# Altium schematic symbol library jlcpcb_2025_04_capacitors_extended_0805.schlib: 3281 symbols (part 13 of 18) (continued)
## FM21X822K101PXG
designator C?  Capacitance: 8.2nF  (hidden comment: *)
Capacitor, Ceramic (MLCC), 8.2nF, ±10%, 100V, X7R, ±10%, SMD 0805; Manufacturer: PSA(Prosperity Dielectrics); Manufacturer Part Number: FM21X822K101PXG; Package Size: 0805; JLCPCB Basic Part: No; JLCPCB Part Number: C565639; Supplier 1: LCSC; Category: Capacitors - MLCC; Supplier Part Number 1: C565639; Tolerance: ±10%; Voltage Rating: 100V; Temperature Coefficient: X7R; RoHS: Yes; ComponentLink1Description: Datasheet; ComponentLink1URL: https://wmsc.lcsc.com/wmsc/upload/file/pdf/v2/lcsc/2304140030_PSA-Prosperity-Dielectrics-FM21X822K101PXG_C565639.pdf; ComponentLink2Description: JLCPCB Part URL; ComponentLink2URL: https://jlcpcb.com/partdetail/C565639; ComponentLink3Description: LCSC Part URL; ComponentLink3URL: https://lcsc.com/product-detail/Multilayer-Ceramic-Capacitors-MLCC---SMD-SMT_PSAProsperity-Dielectrics-PSAProsperity-Dielectrics-FM21X822K101PXG_C565639.html
footprint CAP-0805 (0805 (2012M) Capacitor)
pins: 1, 2

## FM21X822K251ECG
designator C?  Capacitance: 8.2nF  (hidden comment: *)
Capacitor, Ceramic (MLCC), 8.2nF, ±10%, 250V, X7R, ±10%, SMD 0805; Manufacturer: PSA(Prosperity Dielectrics); Manufacturer Part Number: FM21X822K251ECG; Package Size: 0805; JLCPCB Basic Part: No; JLCPCB Part Number: C565661; Supplier 1: LCSC; Category: Capacitors - MLCC; Supplier Part Number 1: C565661; Tolerance: ±10%; Voltage Rating: 250V; Temperature Coefficient: X7R; RoHS: Yes; ComponentLink1Description: Datasheet; ComponentLink1URL: https://wmsc.lcsc.com/wmsc/upload/file/pdf/v2/lcsc/2304140030_PSA-Prosperity-Dielectrics-FM21X822K251ECG_C565661.pdf; ComponentLink2Description: JLCPCB Part URL; ComponentLink2URL: https://jlcpcb.com/partdetail/C565661; ComponentLink3Description: LCSC Part URL; ComponentLink3URL: https://lcsc.com/product-detail/Multilayer-Ceramic-Capacitors-MLCC---SMD-SMT_PSAProsperity-Dielectrics-PSAProsperity-Dielectrics-FM21X822K251ECG_C565661.html
footprint CAP-0805 (0805 (2012M) Capacitor)
pins: 1, 2

## FN21F104Z500PAG
designator C?  Capacitance: 100nF  (hidden comment: *)
Capacitor, Ceramic (MLCC), 100nF, 50V, Y5V, SMD 0805; Manufacturer: PSA(Prosperity Dielectrics); Manufacturer Part Number: FN21F104Z500PAG; Temperature Rating: -20%~+80%; Package Size: 0805; JLCPCB Basic Part: No; JLCPCB Part Number: C525279; Supplier 1: LCSC; Category: Capacitors - MLCC; Supplier Part Number 1: C525279; Voltage Rating: 50V; Temperature Coefficient: Y5V; RoHS: Yes; ComponentLink1Description: Datasheet; ComponentLink1URL: https://wmsc.lcsc.com/wmsc/upload/file/pdf/v2/lcsc/2304140030_PSA-Prosperity-Dielectrics-FN21F104Z500PAG_C525279.pdf; ComponentLink2Description: JLCPCB Part URL; ComponentLink2URL: https://jlcpcb.com/partdetail/C525279; ComponentLink3Description: LCSC Part URL; ComponentLink3URL: https://lcsc.com/product-detail/Multilayer-Ceramic-Capacitors-MLCC---SMD-SMT_PSAProsperity-Dielectrics-PSAProsperity-Dielectrics-FN21F104Z500PAG_C525279.html
footprint CAP-0805 (0805 (2012M) Capacitor)
pins: 1, 2

## FN21N1R0B500PAG
designator C?  Capacitance: 1pF  (hidden comment: *)
Capacitor, Ceramic (MLCC), 1pF, 50V, C0G, SMD 0805; Manufacturer: PSA(Prosperity Dielectrics); Manufacturer Part Number: FN21N1R0B500PAG; Package Size: 0805; JLCPCB Basic Part: No; JLCPCB Part Number: C565640; Supplier 1: LCSC; Category: Capacitors - MLCC; Supplier Part Number 1: C565640; Voltage Rating: 50V; Temperature Coefficient: C0G; RoHS: Yes; ComponentLink1Description: Datasheet; ComponentLink1URL: https://wmsc.lcsc.com/wmsc/upload/file/pdf/v2/lcsc/2304140030_PSA-Prosperity-Dielectrics-FN21N1R0B500PAG_C565640.pdf; ComponentLink2Description: JLCPCB Part URL; ComponentLink2URL: https://jlcpcb.com/partdetail/C565640; ComponentLink3Description: LCSC Part URL; ComponentLink3URL: https://lcsc.com/product-detail/Multilayer-Ceramic-Capacitors-MLCC---SMD-SMT_PSAProsperity-Dielectrics-PSAProsperity-Dielectrics-FN21N1R0B500PAG_C565640.html
footprint CAP-0805 (0805 (2012M) Capacitor)
pins: 1, 2

## FN21N1R0C500PAG
designator C?  Capacitance: 1pF  (hidden comment: *)
Capacitor, Ceramic (MLCC), 1pF, 50V, NP0, SMD 0805; Manufacturer: PSA(Prosperity Dielectrics); Manufacturer Part Number: FN21N1R0C500PAG; Package Size: 0805; JLCPCB Basic Part: No; JLCPCB Part Number: C565578; Supplier 1: LCSC; Category: Capacitors - MLCC; Supplier Part Number 1: C565578; Voltage Rating: 50V; Temperature Coefficient: NP0; RoHS: Yes; ComponentLink1Description: Datasheet; ComponentLink1URL: https://wmsc.lcsc.com/wmsc/upload/file/pdf/v2/lcsc/2304140030_PSA-Prosperity-Dielectrics-FN21N1R0C500PAG_C565578.pdf; ComponentLink2Description: JLCPCB Part URL; ComponentLink2URL: https://jlcpcb.com/partdetail/C565578; ComponentLink3Description: LCSC Part URL; ComponentLink3URL: https://lcsc.com/product-detail/Multilayer-Ceramic-Capacitors-MLCC---SMD-SMT_PSAProsperity-Dielectrics-PSAProsperity-Dielectrics-FN21N1R0C500PAG_C565578.html
footprint CAP-0805 (0805 (2012M) Capacitor)
pins: 1, 2

## FN21N1R2B500PAG
designator C?  Capacitance: 1.2pF  (hidden comment: *)
Capacitor, Ceramic (MLCC), 1.2pF, 50V, C0G, SMD 0805; Manufacturer: PSA(Prosperity Dielectrics); Manufacturer Part Number: FN21N1R2B500PAG; Package Size: 0805; JLCPCB Basic Part: No; JLCPCB Part Number: C565641; Supplier 1: LCSC; Category: Capacitors - MLCC; Supplier Part Number 1: C565641; Voltage Rating: 50V; Temperature Coefficient: C0G; RoHS: Yes; ComponentLink1Description: Datasheet; ComponentLink1URL: https://wmsc.lcsc.com/wmsc/upload/file/pdf/v2/lcsc/2304140030_PSA-Prosperity-Dielectrics-FN21N1R2B500PAG_C565641.pdf; ComponentLink2Description: JLCPCB Part URL; ComponentLink2URL: https://jlcpcb.com/partdetail/C565641; ComponentLink3Description: LCSC Part URL; ComponentLink3URL: https://lcsc.com/product-detail/Multilayer-Ceramic-Capacitors-MLCC---SMD-SMT_PSAProsperity-Dielectrics-PSAProsperity-Dielectrics-FN21N1R2B500PAG_C565641.html
footprint CAP-0805 (0805 (2012M) Capacitor)
pins: 1, 2

## FN21N1R2C500PAG
designator C?  Capacitance: 1.2pF  (hidden comment: *)
Capacitor, Ceramic (MLCC), 1.2pF, 50V, C0G, SMD 0805; Manufacturer: PSA(Prosperity Dielectrics); Manufacturer Part Number: FN21N1R2C500PAG; Package Size: 0805; JLCPCB Basic Part: No; JLCPCB Part Number: C565579; Supplier 1: LCSC; Category: Capacitors - MLCC; Supplier Part Number 1: C565579; Voltage Rating: 50V; Temperature Coefficient: C0G; RoHS: Yes; ComponentLink1Description: Datasheet; ComponentLink1URL: https://wmsc.lcsc.com/wmsc/upload/file/pdf/v2/lcsc/2304140030_PSA-Prosperity-Dielectrics-FN21N1R2C500PAG_C565579.pdf; ComponentLink2Description: JLCPCB Part URL; ComponentLink2URL: https://jlcpcb.com/partdetail/C565579; ComponentLink3Description: LCSC Part URL; ComponentLink3URL: https://lcsc.com/product-detail/Multilayer-Ceramic-Capacitors-MLCC---SMD-SMT_PSAProsperity-Dielectrics-PSAProsperity-Dielectrics-FN21N1R2C500PAG_C565579.html
footprint CAP-0805 (0805 (2012M) Capacitor)
pins: 1, 2

## FN21N1R5B500PAG
designator C?  Capacitance: 1.5pF  (hidden comment: *)
Capacitor, Ceramic (MLCC), 1.5pF, 50V, SMD 0805; Manufacturer: PSA(Prosperity Dielectrics); Manufacturer Part Number: FN21N1R5B500PAG; Package Size: 0805; JLCPCB Basic Part: No; JLCPCB Part Number: C565642; Supplier 1: LCSC; Category: Capacitors - MLCC; Supplier Part Number 1: C565642; Voltage Rating: 50V; RoHS: Yes; ComponentLink1Description: Datasheet; ComponentLink1URL: https://wmsc.lcsc.com/wmsc/upload/file/pdf/v2/lcsc/2304140030_PSA-Prosperity-Dielectrics-FN21N1R5B500PAG_C565642.pdf; ComponentLink2Description: JLCPCB Part URL; ComponentLink2URL: https://jlcpcb.com/partdetail/C565642; ComponentLink3Description: LCSC Part URL; ComponentLink3URL: https://lcsc.com/product-detail/Multilayer-Ceramic-Capacitors-MLCC---SMD-SMT_PSAProsperity-Dielectrics-PSAProsperity-Dielectrics-FN21N1R5B500PAG_C565642.html
footprint CAP-0805 (0805 (2012M) Capacitor)
pins: 1, 2

## FN21N1R5C500PAG
designator C?  Capacitance: 1.5pF  (hidden comment: *)
Capacitor, Ceramic (MLCC), 1.5pF, 50V, SMD 0805; Manufacturer: PSA(Prosperity Dielectrics); Manufacturer Part Number: FN21N1R5C500PAG; Package Size: 0805; JLCPCB Basic Part: No; JLCPCB Part Number: C565580; Supplier 1: LCSC; Category: Capacitors - MLCC; Supplier Part Number 1: C565580; Voltage Rating: 50V; RoHS: Yes; ComponentLink1Description: Datasheet; ComponentLink1URL: https://wmsc.lcsc.com/wmsc/upload/file/pdf/v2/lcsc/2304140030_PSA-Prosperity-Dielectrics-FN21N1R5C500PAG_C565580.pdf; ComponentLink2Description: JLCPCB Part URL; ComponentLink2URL: https://jlcpcb.com/partdetail/C565580; ComponentLink3Description: LCSC Part URL; ComponentLink3URL: https://lcsc.com/product-detail/Multilayer-Ceramic-Capacitors-MLCC---SMD-SMT_PSAProsperity-Dielectrics-PSAProsperity-Dielectrics-FN21N1R5C500PAG_C565580.html
footprint CAP-0805 (0805 (2012M) Capacitor)
pins: 1, 2

## FN21N1R8B500PAG
designator C?  Capacitance: 1.8pF  (hidden comment: *)
Capacitor, Ceramic (MLCC), 1.8pF, 50V, C0G, SMD 0805; Manufacturer: PSA(Prosperity Dielectrics); Manufacturer Part Number: FN21N1R8B500PAG; Package Size: 0805; JLCPCB Basic Part: No; JLCPCB Part Number: C565643; Supplier 1: LCSC; Category: Capacitors - MLCC; Supplier Part Number 1: C565643; Voltage Rating: 50V; Temperature Coefficient: C0G; RoHS: Yes; ComponentLink1Description: Datasheet; ComponentLink1URL: https://wmsc.lcsc.com/wmsc/upload/file/pdf/v2/lcsc/2304140030_PSA-Prosperity-Dielectrics-FN21N1R8B500PAG_C565643.pdf; ComponentLink2Description: JLCPCB Part URL; ComponentLink2URL: https://jlcpcb.com/partdetail/C565643; ComponentLink3Description: LCSC Part URL; ComponentLink3URL: https://lcsc.com/product-detail/Multilayer-Ceramic-Capacitors-MLCC---SMD-SMT_PSAProsperity-Dielectrics-PSAProsperity-Dielectrics-FN21N1R8B500PAG_C565643.html
footprint CAP-0805 (0805 (2012M) Capacitor)
pins: 1, 2

## FN21N1R8C500PAG
designator C?  Capacitance: 1.8pF  (hidden comment: *)
Capacitor, Ceramic (MLCC), 1.8pF, 50V, C0G, SMD 0805; Manufacturer: PSA(Prosperity Dielectrics); Manufacturer Part Number: FN21N1R8C500PAG; Package Size: 0805; JLCPCB Basic Part: No; JLCPCB Part Number: C565581; Supplier 1: LCSC; Category: Capacitors - MLCC; Supplier Part Number 1: C565581; Voltage Rating: 50V; Temperature Coefficient: C0G; RoHS: Yes; ComponentLink1Description: Datasheet; ComponentLink1URL: https://wmsc.lcsc.com/wmsc/upload/file/pdf/v2/lcsc/2304140030_PSA-Prosperity-Dielectrics-FN21N1R8C500PAG_C565581.pdf; ComponentLink2Description: JLCPCB Part URL; ComponentLink2URL: https://jlcpcb.com/partdetail/C565581; ComponentLink3Description: LCSC Part URL; ComponentLink3URL: https://lcsc.com/product-detail/Multilayer-Ceramic-Capacitors-MLCC---SMD-SMT_PSAProsperity-Dielectrics-PSAProsperity-Dielectrics-FN21N1R8C500PAG_C565581.html
footprint CAP-0805 (0805 (2012M) Capacitor)
pins: 1, 2

## FN21N2R2B500PAG
designator C?  Capacitance: 2.2pF  (hidden comment: *)
Capacitor, Ceramic (MLCC), 2.2pF, 50V, C0G, SMD 0805; Manufacturer: PSA(Prosperity Dielectrics); Manufacturer Part Number: FN21N2R2B500PAG; Package Size: 0805; JLCPCB Basic Part: No; JLCPCB Part Number: C565644; Supplier 1: LCSC; Category: Capacitors - MLCC; Supplier Part Number 1: C565644; Voltage Rating: 50V; Temperature Coefficient: C0G; RoHS: Yes; ComponentLink1Description: Datasheet; ComponentLink1URL: https://wmsc.lcsc.com/wmsc/upload/file/pdf/v2/lcsc/2304140030_PSA-Prosperity-Dielectrics-FN21N2R2B500PAG_C565644.pdf; ComponentLink2Description: JLCPCB Part URL; ComponentLink2URL: https://jlcpcb.com/partdetail/C565644; ComponentLink3Description: LCSC Part URL; ComponentLink3URL: https://lcsc.com/product-detail/Multilayer-Ceramic-Capacitors-MLCC---SMD-SMT_PSAProsperity-Dielectrics-PSAProsperity-Dielectrics-FN21N2R2B500PAG_C565644.html
footprint CAP-0805 (0805 (2012M) Capacitor)
pins: 1, 2

## FN21N2R2C500PAG
designator C?  Capacitance: 2.2pF  (hidden comment: *)
Capacitor, Ceramic (MLCC), 2.2pF, 50V, C0G, SMD 0805; Manufacturer: PSA(Prosperity Dielectrics); Manufacturer Part Number: FN21N2R2C500PAG; Package Size: 0805; JLCPCB Basic Part: No; JLCPCB Part Number: C565582; Supplier 1: LCSC; Category: Capacitors - MLCC; Supplier Part Number 1: C565582; Voltage Rating: 50V; Temperature Coefficient: C0G; RoHS: Yes; ComponentLink1Description: Datasheet; ComponentLink1URL: https://wmsc.lcsc.com/wmsc/upload/file/pdf/v2/lcsc/2304140030_PSA-Prosperity-Dielectrics-FN21N2R2C500PAG_C565582.pdf; ComponentLink2Description: JLCPCB Part URL; ComponentLink2URL: https://jlcpcb.com/partdetail/C565582; ComponentLink3Description: LCSC Part URL; ComponentLink3URL: https://lcsc.com/product-detail/Multilayer-Ceramic-Capacitors-MLCC---SMD-SMT_PSAProsperity-Dielectrics-PSAProsperity-Dielectrics-FN21N2R2C500PAG_C565582.html
footprint CAP-0805 (0805 (2012M) Capacitor)
pins: 1, 2

## FN21N2R7C500PAG
designator C?  Capacitance: 2.7pF  (hidden comment: *)
Capacitor, Ceramic (MLCC), 2.7pF, 50V, C0G, SMD 0805; Manufacturer: PSA(Prosperity Dielectrics); Manufacturer Part Number: FN21N2R7C500PAG; Package Size: 0805; JLCPCB Basic Part: No; JLCPCB Part Number: C565583; Supplier 1: LCSC; Category: Capacitors - MLCC; Supplier Part Number 1: C565583; Voltage Rating: 50V; Temperature Coefficient: C0G; RoHS: Yes; ComponentLink1Description: Datasheet; ComponentLink1URL: https://wmsc.lcsc.com/wmsc/upload/file/pdf/v2/lcsc/2304140030_PSA-Prosperity-Dielectrics-FN21N2R7C500PAG_C565583.pdf; ComponentLink2Description: JLCPCB Part URL; ComponentLink2URL: https://jlcpcb.com/partdetail/C565583; ComponentLink3Description: LCSC Part URL; ComponentLink3URL: https://lcsc.com/product-detail/Multilayer-Ceramic-Capacitors-MLCC---SMD-SMT_PSAProsperity-Dielectrics-PSAProsperity-Dielectrics-FN21N2R7C500PAG_C565583.html
footprint CAP-0805 (0805 (2012M) Capacitor)
pins: 1, 2

## FN21N3R3B500PAG
designator C?  Capacitance: 3.3pF  (hidden comment: *)
Capacitor, Ceramic (MLCC), 3.3pF, 50V, C0G, SMD 0805; Manufacturer: PSA(Prosperity Dielectrics); Manufacturer Part Number: FN21N3R3B500PAG; Package Size: 0805; JLCPCB Basic Part: No; JLCPCB Part Number: C565646; Supplier 1: LCSC; Category: Capacitors - MLCC; Supplier Part Number 1: C565646; Voltage Rating: 50V; Temperature Coefficient: C0G; RoHS: Yes; ComponentLink1Description: Datasheet; ComponentLink1URL: https://wmsc.lcsc.com/wmsc/upload/file/pdf/v2/lcsc/2304140030_PSA-Prosperity-Dielectrics-FN21N3R3B500PAG_C565646.pdf; ComponentLink2Description: JLCPCB Part URL; ComponentLink2URL: https://jlcpcb.com/partdetail/C565646; ComponentLink3Description: LCSC Part URL; ComponentLink3URL: https://lcsc.com/product-detail/Multilayer-Ceramic-Capacitors-MLCC---SMD-SMT_PSAProsperity-Dielectrics-PSAProsperity-Dielectrics-FN21N3R3B500PAG_C565646.html
footprint CAP-0805 (0805 (2012M) Capacitor)
pins: 1, 2

## FN21N3R3C500PAG
designator C?  Capacitance: 3.3pF  (hidden comment: *)
Capacitor, Ceramic (MLCC), 3.3pF, 50V, C0G, SMD 0805; Manufacturer: PSA(Prosperity Dielectrics); Manufacturer Part Number: FN21N3R3C500PAG; Package Size: 0805; JLCPCB Basic Part: No; JLCPCB Part Number: C565584; Supplier 1: LCSC; Category: Capacitors - MLCC; Supplier Part Number 1: C565584; Voltage Rating: 50V; Temperature Coefficient: C0G; RoHS: Yes; ComponentLink1Description: Datasheet; ComponentLink1URL: https://wmsc.lcsc.com/wmsc/upload/file/pdf/v2/lcsc/2304140030_PSA-Prosperity-Dielectrics-FN21N3R3C500PAG_C565584.pdf; ComponentLink2Description: JLCPCB Part URL; ComponentLink2URL: https://jlcpcb.com/partdetail/C565584; ComponentLink3Description: LCSC Part URL; ComponentLink3URL: https://lcsc.com/product-detail/Multilayer-Ceramic-Capacitors-MLCC---SMD-SMT_PSAProsperity-Dielectrics-PSAProsperity-Dielectrics-FN21N3R3C500PAG_C565584.html
footprint CAP-0805 (0805 (2012M) Capacitor)
pins: 1, 2

## FN21N3R9B500PAG
designator C?  Capacitance: 3.9pF  (hidden comment: *)
Capacitor, Ceramic (MLCC), 3.9pF, 50V, C0G, SMD 0805; Manufacturer: PSA(Prosperity Dielectrics); Manufacturer Part Number: FN21N3R9B500PAG; Package Size: 0805; JLCPCB Basic Part: No; JLCPCB Part Number: C565647; Supplier 1: LCSC; Category: Capacitors - MLCC; Supplier Part Number 1: C565647; Voltage Rating: 50V; Temperature Coefficient: C0G; RoHS: Yes; ComponentLink1Description: Datasheet; ComponentLink1URL: https://wmsc.lcsc.com/wmsc/upload/file/pdf/v2/lcsc/2304140030_PSA-Prosperity-Dielectrics-FN21N3R9B500PAG_C565647.pdf; ComponentLink2Description: JLCPCB Part URL; ComponentLink2URL: https://jlcpcb.com/partdetail/C565647; ComponentLink3Description: LCSC Part URL; ComponentLink3URL: https://lcsc.com/product-detail/Multilayer-Ceramic-Capacitors-MLCC---SMD-SMT_PSAProsperity-Dielectrics-PSAProsperity-Dielectrics-FN21N3R9B500PAG_C565647.html
footprint CAP-0805 (0805 (2012M) Capacitor)
pins: 1, 2

## FN21N3R9C500PAG
designator C?  Capacitance: 3.9pF  (hidden comment: *)
Capacitor, Ceramic (MLCC), 3.9pF, 50V, C0G, SMD 0805; Manufacturer: PSA(Prosperity Dielectrics); Manufacturer Part Number: FN21N3R9C500PAG; Package Size: 0805; JLCPCB Basic Part: No; JLCPCB Part Number: C565585; Supplier 1: LCSC; Category: Capacitors - MLCC; Supplier Part Number 1: C565585; Voltage Rating: 50V; Temperature Coefficient: C0G; RoHS: Yes; ComponentLink1Description: Datasheet; ComponentLink1URL: https://wmsc.lcsc.com/wmsc/upload/file/pdf/v2/lcsc/2304140030_PSA-Prosperity-Dielectrics-FN21N3R9C500PAG_C565585.pdf; ComponentLink2Description: JLCPCB Part URL; ComponentLink2URL: https://jlcpcb.com/partdetail/C565585; ComponentLink3Description: LCSC Part URL; ComponentLink3URL: https://lcsc.com/product-detail/Multilayer-Ceramic-Capacitors-MLCC---SMD-SMT_PSAProsperity-Dielectrics-PSAProsperity-Dielectrics-FN21N3R9C500PAG_C565585.html
footprint CAP-0805 (0805 (2012M) Capacitor)
pins: 1, 2

## FN21N4R7B500PAG
designator C?  Capacitance: 4.7pF  (hidden comment: *)
Capacitor, Ceramic (MLCC), 4.7pF, 50V, C0G, SMD 0805; Manufacturer: PSA(Prosperity Dielectrics); Manufacturer Part Number: FN21N4R7B500PAG; Package Size: 0805; JLCPCB Basic Part: No; JLCPCB Part Number: C565648; Supplier 1: LCSC; Category: Capacitors - MLCC; Supplier Part Number 1: C565648; Voltage Rating: 50V; Temperature Coefficient: C0G; RoHS: Yes; ComponentLink1Description: Datasheet; ComponentLink1URL: https://wmsc.lcsc.com/wmsc/upload/file/pdf/v2/lcsc/2304140030_PSA-Prosperity-Dielectrics-FN21N4R7B500PAG_C565648.pdf; ComponentLink2Description: JLCPCB Part URL; ComponentLink2URL: https://jlcpcb.com/partdetail/C565648; ComponentLink3Description: LCSC Part URL; ComponentLink3URL: https://lcsc.com/product-detail/Multilayer-Ceramic-Capacitors-MLCC---SMD-SMT_PSAProsperity-Dielectrics-PSAProsperity-Dielectrics-FN21N4R7B500PAG_C565648.html
footprint CAP-0805 (0805 (2012M) Capacitor)
pins: 1, 2

## FN21N4R7C500PAG
designator C?  Capacitance: 4.7pF  (hidden comment: *)
Capacitor, Ceramic (MLCC), 4.7pF, 50V, C0G, SMD 0805; Manufacturer: PSA(Prosperity Dielectrics); Manufacturer Part Number: FN21N4R7C500PAG; Package Size: 0805; JLCPCB Basic Part: No; JLCPCB Part Number: C565586; Supplier 1: LCSC; Category: Capacitors - MLCC; Supplier Part Number 1: C565586; Voltage Rating: 50V; Temperature Coefficient: C0G; RoHS: Yes; ComponentLink1Description: Datasheet; ComponentLink1URL: https://wmsc.lcsc.com/wmsc/upload/file/pdf/v2/lcsc/2304140030_PSA-Prosperity-Dielectrics-FN21N4R7C500PAG_C565586.pdf; ComponentLink2Description: JLCPCB Part URL; ComponentLink2URL: https://jlcpcb.com/partdetail/C565586; ComponentLink3Description: LCSC Part URL; ComponentLink3URL: https://lcsc.com/product-detail/Multilayer-Ceramic-Capacitors-MLCC---SMD-SMT_PSAProsperity-Dielectrics-PSAProsperity-Dielectrics-FN21N4R7C500PAG_C565586.html
footprint CAP-0805 (0805 (2012M) Capacitor)
pins: 1, 2

## FN21N5R6C500PAG
designator C?  Capacitance: 5.6pF  (hidden comment: *)
Capacitor, Ceramic (MLCC), 5.6pF, 50V, C0G, SMD 0805; Manufacturer: PSA(Prosperity Dielectrics); Manufacturer Part Number: FN21N5R6C500PAG; Package Size: 0805; JLCPCB Basic Part: No; JLCPCB Part Number: C565649; Supplier 1: LCSC; Category: Capacitors - MLCC; Supplier Part Number 1: C565649; Voltage Rating: 50V; Temperature Coefficient: C0G; RoHS: Yes; ComponentLink1Description: Datasheet; ComponentLink1URL: https://wmsc.lcsc.com/wmsc/upload/file/pdf/v2/lcsc/2304140030_PSA-Prosperity-Dielectrics-FN21N5R6C500PAG_C565649.pdf; ComponentLink2Description: JLCPCB Part URL; ComponentLink2URL: https://jlcpcb.com/partdetail/C565649; ComponentLink3Description: LCSC Part URL; ComponentLink3URL: https://lcsc.com/product-detail/Multilayer-Ceramic-Capacitors-MLCC---SMD-SMT_PSAProsperity-Dielectrics-PSAProsperity-Dielectrics-FN21N5R6C500PAG_C565649.html
footprint CAP-0805 (0805 (2012M) Capacitor)
pins: 1, 2

## FN21N5R6D500PAG
designator C?  Capacitance: 5.6pF  (hidden comment: *)
Capacitor, Ceramic (MLCC), 5.6pF, 50V, C0G, SMD 0805; Manufacturer: PSA(Prosperity Dielectrics); Manufacturer Part Number: FN21N5R6D500PAG; Package Size: 0805; JLCPCB Basic Part: No; JLCPCB Part Number: C565587; Supplier 1: LCSC; Category: Capacitors - MLCC; Supplier Part Number 1: C565587; Voltage Rating: 50V; Temperature Coefficient: C0G; RoHS: Yes; ComponentLink1Description: Datasheet; ComponentLink1URL: https://wmsc.lcsc.com/wmsc/upload/file/pdf/v2/lcsc/2304140030_PSA-Prosperity-Dielectrics-FN21N5R6D500PAG_C565587.pdf; ComponentLink2Description: JLCPCB Part URL; ComponentLink2URL: https://jlcpcb.com/partdetail/C565587; ComponentLink3Description: LCSC Part URL; ComponentLink3URL: https://lcsc.com/product-detail/Multilayer-Ceramic-Capacitors-MLCC---SMD-SMT_PSAProsperity-Dielectrics-PSAProsperity-Dielectrics-FN21N5R6D500PAG_C565587.html
footprint CAP-0805 (0805 (2012M) Capacitor)
pins: 1, 2

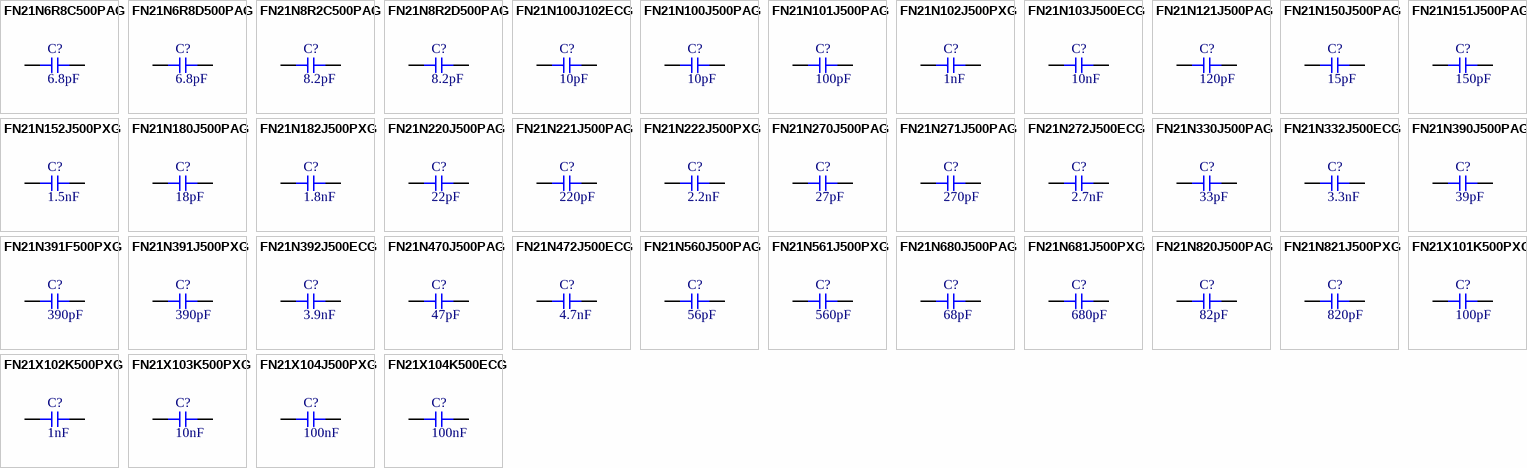
[diagram p58: symbols FN21N6R8C500PAG to FN21X104K500ECG]

## FN21N6R8C500PAG
designator C?  Capacitance: 6.8pF  (hidden comment: *)
Capacitor, Ceramic (MLCC), 6.8pF, 50V, NP0, SMD 0805; Manufacturer: PSA(Prosperity Dielectrics); Manufacturer Part Number: FN21N6R8C500PAG; Package Size: 0805; JLCPCB Basic Part: No; JLCPCB Part Number: C565650; Supplier 1: LCSC; Category: Capacitors - MLCC; Supplier Part Number 1: C565650; Voltage Rating: 50V; Temperature Coefficient: NP0; RoHS: Yes; ComponentLink1Description: Datasheet; ComponentLink1URL: https://wmsc.lcsc.com/wmsc/upload/file/pdf/v2/lcsc/2304140030_PSA-Prosperity-Dielectrics-FN21N6R8C500PAG_C565650.pdf; ComponentLink2Description: JLCPCB Part URL; ComponentLink2URL: https://jlcpcb.com/partdetail/C565650; ComponentLink3Description: LCSC Part URL; ComponentLink3URL: https://lcsc.com/product-detail/Multilayer-Ceramic-Capacitors-MLCC---SMD-SMT_PSAProsperity-Dielectrics-PSAProsperity-Dielectrics-FN21N6R8C500PAG_C565650.html
footprint CAP-0805 (0805 (2012M) Capacitor)
pins: 1, 2

## FN21N6R8D500PAG
designator C?  Capacitance: 6.8pF  (hidden comment: *)
Capacitor, Ceramic (MLCC), 6.8pF, 50V, C0G, SMD 0805; Manufacturer: PSA(Prosperity Dielectrics); Manufacturer Part Number: FN21N6R8D500PAG; Package Size: 0805; JLCPCB Basic Part: No; JLCPCB Part Number: C565588; Supplier 1: LCSC; Category: Capacitors - MLCC; Supplier Part Number 1: C565588; Voltage Rating: 50V; Temperature Coefficient: C0G; RoHS: Yes; ComponentLink1Description: Datasheet; ComponentLink1URL: https://wmsc.lcsc.com/wmsc/upload/file/pdf/v2/lcsc/2304140030_PSA-Prosperity-Dielectrics-FN21N6R8D500PAG_C565588.pdf; ComponentLink2Description: JLCPCB Part URL; ComponentLink2URL: https://jlcpcb.com/partdetail/C565588; ComponentLink3Description: LCSC Part URL; ComponentLink3URL: https://lcsc.com/product-detail/Multilayer-Ceramic-Capacitors-MLCC---SMD-SMT_PSAProsperity-Dielectrics-PSAProsperity-Dielectrics-FN21N6R8D500PAG_C565588.html
footprint CAP-0805 (0805 (2012M) Capacitor)
pins: 1, 2

## FN21N8R2C500PAG
designator C?  Capacitance: 8.2pF  (hidden comment: *)
Capacitor, Ceramic (MLCC), 8.2pF, 50V, C0G, SMD 0805; Manufacturer: PSA(Prosperity Dielectrics); Manufacturer Part Number: FN21N8R2C500PAG; Package Size: 0805; JLCPCB Basic Part: No; JLCPCB Part Number: C565651; Supplier 1: LCSC; Category: Capacitors - MLCC; Supplier Part Number 1: C565651; Voltage Rating: 50V; Temperature Coefficient: C0G; RoHS: Yes; ComponentLink1Description: Datasheet; ComponentLink1URL: https://wmsc.lcsc.com/wmsc/upload/file/pdf/v2/lcsc/2304140030_PSA-Prosperity-Dielectrics-FN21N8R2C500PAG_C565651.pdf; ComponentLink2Description: JLCPCB Part URL; ComponentLink2URL: https://jlcpcb.com/partdetail/C565651; ComponentLink3Description: LCSC Part URL; ComponentLink3URL: https://lcsc.com/product-detail/Multilayer-Ceramic-Capacitors-MLCC---SMD-SMT_PSAProsperity-Dielectrics-PSAProsperity-Dielectrics-FN21N8R2C500PAG_C565651.html
footprint CAP-0805 (0805 (2012M) Capacitor)
pins: 1, 2

## FN21N8R2D500PAG
designator C?  Capacitance: 8.2pF  (hidden comment: *)
Capacitor, Ceramic (MLCC), 8.2pF, 50V, C0G, SMD 0805; Manufacturer: PSA(Prosperity Dielectrics); Manufacturer Part Number: FN21N8R2D500PAG; Package Size: 0805; JLCPCB Basic Part: No; JLCPCB Part Number: C565589; Supplier 1: LCSC; Category: Capacitors - MLCC; Supplier Part Number 1: C565589; Voltage Rating: 50V; Temperature Coefficient: C0G; RoHS: Yes; ComponentLink1Description: Datasheet; ComponentLink1URL: https://wmsc.lcsc.com/wmsc/upload/file/pdf/v2/lcsc/2304140030_PSA-Prosperity-Dielectrics-FN21N8R2D500PAG_C565589.pdf; ComponentLink2Description: JLCPCB Part URL; ComponentLink2URL: https://jlcpcb.com/partdetail/C565589; ComponentLink3Description: LCSC Part URL; ComponentLink3URL: https://lcsc.com/product-detail/Multilayer-Ceramic-Capacitors-MLCC---SMD-SMT_PSAProsperity-Dielectrics-PSAProsperity-Dielectrics-FN21N8R2D500PAG_C565589.html
footprint CAP-0805 (0805 (2012M) Capacitor)
pins: 1, 2

## FN21N100J102ECG
designator C?  Capacitance: 10pF  (hidden comment: *)
Capacitor, Ceramic (MLCC), 10pF, ±5%, 1kV, ±5%, SMD 0805; Manufacturer: PSA(Prosperity Dielectrics); Manufacturer Part Number: FN21N100J102ECG; Package Size: 0805; JLCPCB Basic Part: No; JLCPCB Part Number: C565669; Supplier 1: LCSC; Category: Capacitors - MLCC; Supplier Part Number 1: C565669; Tolerance: ±5%; Voltage Rating: 1kV; RoHS: Yes; ComponentLink1Description: Datasheet; ComponentLink1URL: https://wmsc.lcsc.com/wmsc/upload/file/pdf/v2/lcsc/2304140030_PSA-Prosperity-Dielectrics-FN21N100J102ECG_C565669.pdf; ComponentLink2Description: JLCPCB Part URL; ComponentLink2URL: https://jlcpcb.com/partdetail/C565669; ComponentLink3Description: LCSC Part URL; ComponentLink3URL: https://lcsc.com/product-detail/Multilayer-Ceramic-Capacitors-MLCC---SMD-SMT_PSAProsperity-Dielectrics-PSAProsperity-Dielectrics-FN21N100J102ECG_C565669.html
footprint CAP-0805 (0805 (2012M) Capacitor)
pins: 1, 2

## FN21N100J500PAG
designator C?  Capacitance: 10pF  (hidden comment: *)
Capacitor, Ceramic (MLCC), 10pF, ±5%, 50V, C0G, ±5%, SMD 0805; Manufacturer: PSA(Prosperity Dielectrics); Manufacturer Part Number: FN21N100J500PAG; Package Size: 0805; JLCPCB Basic Part: No; JLCPCB Part Number: C525280; Supplier 1: LCSC; Category: Capacitors - MLCC; Supplier Part Number 1: C525280; Tolerance: ±5%; Voltage Rating: 50V; Temperature Coefficient: C0G; RoHS: Yes; ComponentLink1Description: Datasheet; ComponentLink1URL: https://wmsc.lcsc.com/wmsc/upload/file/pdf/v2/lcsc/2304140030_PSA-Prosperity-Dielectrics-FN21N100J500PAG_C525280.pdf; ComponentLink2Description: JLCPCB Part URL; ComponentLink2URL: https://jlcpcb.com/partdetail/C525280; ComponentLink3Description: LCSC Part URL; ComponentLink3URL: https://lcsc.com/product-detail/Multilayer-Ceramic-Capacitors-MLCC---SMD-SMT_PSAProsperity-Dielectrics-PSAProsperity-Dielectrics-FN21N100J500PAG_C525280.html
footprint CAP-0805 (0805 (2012M) Capacitor)
pins: 1, 2

## FN21N101J500PAG
designator C?  Capacitance: 100pF  (hidden comment: *)
Capacitor, Ceramic (MLCC), 100pF, ±5%, 50V, C0G, ±5%, SMD 0805; Manufacturer: PSA(Prosperity Dielectrics); Manufacturer Part Number: FN21N101J500PAG; Package Size: 0805; JLCPCB Basic Part: No; JLCPCB Part Number: C525281; Supplier 1: LCSC; Category: Capacitors - MLCC; Supplier Part Number 1: C525281; Tolerance: ±5%; Voltage Rating: 50V; Temperature Coefficient: C0G; RoHS: Yes; ComponentLink1Description: Datasheet; ComponentLink1URL: https://wmsc.lcsc.com/wmsc/upload/file/pdf/v2/lcsc/2304140030_PSA-Prosperity-Dielectrics-FN21N101J500PAG_C525281.pdf; ComponentLink2Description: JLCPCB Part URL; ComponentLink2URL: https://jlcpcb.com/partdetail/C525281; ComponentLink3Description: LCSC Part URL; ComponentLink3URL: https://lcsc.com/product-detail/Multilayer-Ceramic-Capacitors-MLCC---SMD-SMT_PSAProsperity-Dielectrics-PSAProsperity-Dielectrics-FN21N101J500PAG_C525281.html
footprint CAP-0805 (0805 (2012M) Capacitor)
pins: 1, 2

## FN21N102J500PXG
designator C?  Capacitance: 1nF  (hidden comment: *)
Capacitor, Ceramic (MLCC), 1nF, ±5%, 50V, C0G, ±5%, SMD 0805; Manufacturer: PSA(Prosperity Dielectrics); Manufacturer Part Number: FN21N102J500PXG; Package Size: 0805; JLCPCB Basic Part: No; JLCPCB Part Number: C525282; Supplier 1: LCSC; Category: Capacitors - MLCC; Supplier Part Number 1: C525282; Tolerance: ±5%; Voltage Rating: 50V; Temperature Coefficient: C0G; RoHS: Yes; ComponentLink1Description: Datasheet; ComponentLink1URL: https://wmsc.lcsc.com/wmsc/upload/file/pdf/v2/lcsc/2304140030_PSA-Prosperity-Dielectrics-FN21N102J500PXG_C525282.pdf; ComponentLink2Description: JLCPCB Part URL; ComponentLink2URL: https://jlcpcb.com/partdetail/C525282; ComponentLink3Description: LCSC Part URL; ComponentLink3URL: https://lcsc.com/product-detail/Multilayer-Ceramic-Capacitors-MLCC---SMD-SMT_PSAProsperity-Dielectrics-PSAProsperity-Dielectrics-FN21N102J500PXG_C525282.html
footprint CAP-0805 (0805 (2012M) Capacitor)
pins: 1, 2

## FN21N103J500ECG
designator C?  Capacitance: 10nF  (hidden comment: *)
Capacitor, Ceramic (MLCC), 10nF, ±5%, 50V, C0G, ±5%, SMD 0805; Manufacturer: PSA(Prosperity Dielectrics); Manufacturer Part Number: FN21N103J500ECG; Package Size: 0805; JLCPCB Basic Part: No; JLCPCB Part Number: C525283; Supplier 1: LCSC; Category: Capacitors - MLCC; Supplier Part Number 1: C525283; Tolerance: ±5%; Voltage Rating: 50V; Temperature Coefficient: C0G; RoHS: Yes; ComponentLink1Description: Datasheet; ComponentLink1URL: https://wmsc.lcsc.com/wmsc/upload/file/pdf/v2/lcsc/2304140030_PSA-Prosperity-Dielectrics-FN21N103J500ECG_C525283.pdf; ComponentLink2Description: JLCPCB Part URL; ComponentLink2URL: https://jlcpcb.com/partdetail/C525283; ComponentLink3Description: LCSC Part URL; ComponentLink3URL: https://lcsc.com/product-detail/Multilayer-Ceramic-Capacitors-MLCC---SMD-SMT_PSAProsperity-Dielectrics-PSAProsperity-Dielectrics-FN21N103J500ECG_C525283.html
footprint CAP-0805 (0805 (2012M) Capacitor)
pins: 1, 2

## FN21N121J500PAG
designator C?  Capacitance: 120pF  (hidden comment: *)
Capacitor, Ceramic (MLCC), 120pF, 50V, C0G, SMD 0805; Manufacturer: PSA(Prosperity Dielectrics); Manufacturer Part Number: FN21N121J500PAG; Package Size: 0805; JLCPCB Basic Part: No; JLCPCB Part Number: C2847440; Supplier 1: LCSC; Category: Capacitors - MLCC; Supplier Part Number 1: C2847440; Voltage Rating: 50V; Temperature Coefficient: C0G; RoHS: Yes; ComponentLink1Description: Datasheet; ComponentLink1URL: https://wmsc.lcsc.com/wmsc/upload/file/pdf/v2/lcsc/2108142230_PSA-Prosperity-Dielectrics-FN21N121J500PAG_C2847440.pdf; ComponentLink2Description: JLCPCB Part URL; ComponentLink2URL: https://jlcpcb.com/partdetail/C2847440; ComponentLink3Description: LCSC Part URL; ComponentLink3URL: https://lcsc.com/product-detail/Multilayer-Ceramic-Capacitors-MLCC---SMD-SMT_PSAProsperity-Dielectrics-PSAProsperity-Dielectrics-FN21N121J500PAG_C2847440.html
footprint CAP-0805 (0805 (2012M) Capacitor)
pins: 1, 2

## FN21N150J500PAG
designator C?  Capacitance: 15pF  (hidden comment: *)
Capacitor, Ceramic (MLCC), 15pF, ±5%, 50V, C0G, ±5%, SMD 0805; Manufacturer: PSA(Prosperity Dielectrics); Manufacturer Part Number: FN21N150J500PAG; Package Size: 0805; JLCPCB Basic Part: No; JLCPCB Part Number: C525285; Supplier 1: LCSC; Category: Capacitors - MLCC; Supplier Part Number 1: C525285; Tolerance: ±5%; Voltage Rating: 50V; Temperature Coefficient: C0G; RoHS: Yes; ComponentLink1Description: Datasheet; ComponentLink1URL: https://wmsc.lcsc.com/wmsc/upload/file/pdf/v2/lcsc/2304140030_PSA-Prosperity-Dielectrics-FN21N150J500PAG_C525285.pdf; ComponentLink2Description: JLCPCB Part URL; ComponentLink2URL: https://jlcpcb.com/partdetail/C525285; ComponentLink3Description: LCSC Part URL; ComponentLink3URL: https://lcsc.com/product-detail/Multilayer-Ceramic-Capacitors-MLCC---SMD-SMT_PSAProsperity-Dielectrics-PSAProsperity-Dielectrics-FN21N150J500PAG_C525285.html
footprint CAP-0805 (0805 (2012M) Capacitor)
pins: 1, 2

## FN21N151J500PAG
designator C?  Capacitance: 150pF  (hidden comment: *)
Capacitor, Ceramic (MLCC), 150pF, 50V, C0G, SMD 0805; Manufacturer: PSA(Prosperity Dielectrics); Manufacturer Part Number: FN21N151J500PAG; Package Size: 0805; JLCPCB Basic Part: No; JLCPCB Part Number: C2847439; Supplier 1: LCSC; Category: Capacitors - MLCC; Supplier Part Number 1: C2847439; Voltage Rating: 50V; Temperature Coefficient: C0G; RoHS: Yes; ComponentLink1Description: Datasheet; ComponentLink1URL: https://wmsc.lcsc.com/wmsc/upload/file/pdf/v2/lcsc/2108142230_PSA-Prosperity-Dielectrics-FN21N151J500PAG_C2847439.pdf; ComponentLink2Description: JLCPCB Part URL; ComponentLink2URL: https://jlcpcb.com/partdetail/C2847439; ComponentLink3Description: LCSC Part URL; ComponentLink3URL: https://lcsc.com/product-detail/Multilayer-Ceramic-Capacitors-MLCC---SMD-SMT_PSAProsperity-Dielectrics-PSAProsperity-Dielectrics-FN21N151J500PAG_C2847439.html
footprint CAP-0805 (0805 (2012M) Capacitor)
pins: 1, 2

## FN21N152J500PXG
designator C?  Capacitance: 1.5nF  (hidden comment: *)
Capacitor, Ceramic (MLCC), 1.5nF, 50V, C0G, SMD 0805; Manufacturer: PSA(Prosperity Dielectrics); Manufacturer Part Number: FN21N152J500PXG; Package Size: 0805; JLCPCB Basic Part: No; JLCPCB Part Number: C2874754; Supplier 1: LCSC; Category: Capacitors - MLCC; Supplier Part Number 1: C2874754; Voltage Rating: 50V; Temperature Coefficient: C0G; RoHS: Yes; ComponentLink1Description: Datasheet; ComponentLink1URL: https://wmsc.lcsc.com/wmsc/upload/file/pdf/v2/lcsc/2108150330_PSA-Prosperity-Dielectrics-FN21N152J500PXG_C2874754.pdf; ComponentLink2Description: JLCPCB Part URL; ComponentLink2URL: https://jlcpcb.com/partdetail/C2874754; ComponentLink3Description: LCSC Part URL; ComponentLink3URL: https://lcsc.com/product-detail/Multilayer-Ceramic-Capacitors-MLCC---SMD-SMT_PSAProsperity-Dielectrics-PSAProsperity-Dielectrics-FN21N152J500PXG_C2874754.html
footprint CAP-0805 (0805 (2012M) Capacitor)
pins: 1, 2

## FN21N180J500PAG
designator C?  Capacitance: 18pF  (hidden comment: *)
Capacitor, Ceramic (MLCC), 18pF, ±5%, 50V, C0G, ±5%, SMD 0805; Manufacturer: PSA(Prosperity Dielectrics); Manufacturer Part Number: FN21N180J500PAG; Package Size: 0805; JLCPCB Basic Part: No; JLCPCB Part Number: C565575; Supplier 1: LCSC; Category: Capacitors - MLCC; Supplier Part Number 1: C565575; Tolerance: ±5%; Voltage Rating: 50V; Temperature Coefficient: C0G; RoHS: Yes; ComponentLink1Description: Datasheet; ComponentLink1URL: https://wmsc.lcsc.com/wmsc/upload/file/pdf/v2/lcsc/2304140030_PSA-Prosperity-Dielectrics-FN21N180J500PAG_C565575.pdf; ComponentLink2Description: JLCPCB Part URL; ComponentLink2URL: https://jlcpcb.com/partdetail/C565575; ComponentLink3Description: LCSC Part URL; ComponentLink3URL: https://lcsc.com/product-detail/Multilayer-Ceramic-Capacitors-MLCC---SMD-SMT_PSAProsperity-Dielectrics-PSAProsperity-Dielectrics-FN21N180J500PAG_C565575.html
footprint CAP-0805 (0805 (2012M) Capacitor)
pins: 1, 2

## FN21N182J500PXG
designator C?  Capacitance: 1.8nF  (hidden comment: *)
Capacitor, Ceramic (MLCC), 1.8nF, 50V, C0G, SMD 0805; Manufacturer: PSA(Prosperity Dielectrics); Manufacturer Part Number: FN21N182J500PXG; Package Size: 0805; JLCPCB Basic Part: No; JLCPCB Part Number: C2929167; Supplier 1: LCSC; Category: Capacitors - MLCC; Supplier Part Number 1: C2929167; Voltage Rating: 50V; Temperature Coefficient: C0G; RoHS: Yes; ComponentLink1Description: Datasheet; ComponentLink1URL: https://wmsc.lcsc.com/wmsc/upload/file/pdf/v2/lcsc/2201121400_PSA-Prosperity-Dielectrics-FN21N182J500PXG_C2929167.pdf; ComponentLink2Description: JLCPCB Part URL; ComponentLink2URL: https://jlcpcb.com/partdetail/C2929167; ComponentLink3Description: LCSC Part URL; ComponentLink3URL: https://lcsc.com/product-detail/Multilayer-Ceramic-Capacitors-MLCC---SMD-SMT_PSAProsperity-Dielectrics-PSAProsperity-Dielectrics-FN21N182J500PXG_C2929167.html
footprint CAP-0805 (0805 (2012M) Capacitor)
pins: 1, 2

## FN21N220J500PAG
designator C?  Capacitance: 22pF  (hidden comment: *)
Capacitor, Ceramic (MLCC), 22pF, ±5%, 50V, NP0, ±5%, SMD 0805; Manufacturer: PSA(Prosperity Dielectrics); Manufacturer Part Number: FN21N220J500PAG; Package Size: 0805; JLCPCB Basic Part: No; JLCPCB Part Number: C525286; Supplier 1: LCSC; Category: Capacitors - MLCC; Supplier Part Number 1: C525286; Tolerance: ±5%; Voltage Rating: 50V; Temperature Coefficient: NP0; RoHS: Yes; ComponentLink1Description: Datasheet; ComponentLink1URL: https://wmsc.lcsc.com/wmsc/upload/file/pdf/v2/lcsc/2304140030_PSA-Prosperity-Dielectrics-FN21N220J500PAG_C525286.pdf; ComponentLink2Description: JLCPCB Part URL; ComponentLink2URL: https://jlcpcb.com/partdetail/C525286; ComponentLink3Description: LCSC Part URL; ComponentLink3URL: https://lcsc.com/product-detail/Multilayer-Ceramic-Capacitors-MLCC---SMD-SMT_PSAProsperity-Dielectrics-PSAProsperity-Dielectrics-FN21N220J500PAG_C525286.html
footprint CAP-0805 (0805 (2012M) Capacitor)
pins: 1, 2

## FN21N221J500PAG
designator C?  Capacitance: 220pF  (hidden comment: *)
Capacitor, Ceramic (MLCC), 220pF, ±5%, 50V, C0G, ±5%, SMD 0805; Manufacturer: PSA(Prosperity Dielectrics); Manufacturer Part Number: FN21N221J500PAG; Package Size: 0805; JLCPCB Basic Part: No; JLCPCB Part Number: C525287; Supplier 1: LCSC; Category: Capacitors - MLCC; Supplier Part Number 1: C525287; Tolerance: ±5%; Voltage Rating: 50V; Temperature Coefficient: C0G; RoHS: Yes; ComponentLink1Description: Datasheet; ComponentLink1URL: https://wmsc.lcsc.com/wmsc/upload/file/pdf/v2/lcsc/2304140030_PSA-Prosperity-Dielectrics-FN21N221J500PAG_C525287.pdf; ComponentLink2Description: JLCPCB Part URL; ComponentLink2URL: https://jlcpcb.com/partdetail/C525287; ComponentLink3Description: LCSC Part URL; ComponentLink3URL: https://lcsc.com/product-detail/Multilayer-Ceramic-Capacitors-MLCC---SMD-SMT_PSAProsperity-Dielectrics-PSAProsperity-Dielectrics-FN21N221J500PAG_C525287.html
footprint CAP-0805 (0805 (2012M) Capacitor)
pins: 1, 2

## FN21N222J500PXG
designator C?  Capacitance: 2.2nF  (hidden comment: *)
Capacitor, Ceramic (MLCC), 2.2nF, ±5%, 50V, NP0, ±5%, SMD 0805; Manufacturer: PSA(Prosperity Dielectrics); Manufacturer Part Number: FN21N222J500PXG; Package Size: 0805; JLCPCB Basic Part: No; JLCPCB Part Number: C525288; Supplier 1: LCSC; Category: Capacitors - MLCC; Supplier Part Number 1: C525288; Tolerance: ±5%; Voltage Rating: 50V; Temperature Coefficient: NP0; RoHS: Yes; ComponentLink1Description: Datasheet; ComponentLink1URL: https://wmsc.lcsc.com/wmsc/upload/file/pdf/v2/lcsc/2304140030_PSA-Prosperity-Dielectrics-FN21N222J500PXG_C525288.pdf; ComponentLink2Description: JLCPCB Part URL; ComponentLink2URL: https://jlcpcb.com/partdetail/C525288; ComponentLink3Description: LCSC Part URL; ComponentLink3URL: https://lcsc.com/product-detail/Multilayer-Ceramic-Capacitors-MLCC---SMD-SMT_PSAProsperity-Dielectrics-PSAProsperity-Dielectrics-FN21N222J500PXG_C525288.html
footprint CAP-0805 (0805 (2012M) Capacitor)
pins: 1, 2

## FN21N270J500PAG
designator C?  Capacitance: 27pF  (hidden comment: *)
Capacitor, Ceramic (MLCC), 27pF, ±5%, 50V, C0G, ±5%, SMD 0805; Manufacturer: PSA(Prosperity Dielectrics); Manufacturer Part Number: FN21N270J500PAG; Package Size: 0805; JLCPCB Basic Part: No; JLCPCB Part Number: C525289; Supplier 1: LCSC; Category: Capacitors - MLCC; Supplier Part Number 1: C525289; Tolerance: ±5%; Voltage Rating: 50V; Temperature Coefficient: C0G; RoHS: Yes; ComponentLink1Description: Datasheet; ComponentLink1URL: https://wmsc.lcsc.com/wmsc/upload/file/pdf/v2/lcsc/2304140030_PSA-Prosperity-Dielectrics-FN21N270J500PAG_C525289.pdf; ComponentLink2Description: JLCPCB Part URL; ComponentLink2URL: https://jlcpcb.com/partdetail/C525289; ComponentLink3Description: LCSC Part URL; ComponentLink3URL: https://lcsc.com/product-detail/Multilayer-Ceramic-Capacitors-MLCC---SMD-SMT_PSAProsperity-Dielectrics-PSAProsperity-Dielectrics-FN21N270J500PAG_C525289.html
footprint CAP-0805 (0805 (2012M) Capacitor)
pins: 1, 2

## FN21N271J500PAG
designator C?  Capacitance: 270pF  (hidden comment: *)
Capacitor, Ceramic (MLCC), 270pF, 50V, C0G, SMD 0805; Manufacturer: PSA(Prosperity Dielectrics); Manufacturer Part Number: FN21N271J500PAG; Package Size: 0805; JLCPCB Basic Part: No; JLCPCB Part Number: C2847437; Supplier 1: LCSC; Category: Capacitors - MLCC; Supplier Part Number 1: C2847437; Voltage Rating: 50V; Temperature Coefficient: C0G; RoHS: Yes; ComponentLink1Description: Datasheet; ComponentLink1URL: https://wmsc.lcsc.com/wmsc/upload/file/pdf/v2/lcsc/2108142230_PSA-Prosperity-Dielectrics-FN21N271J500PAG_C2847437.pdf; ComponentLink2Description: JLCPCB Part URL; ComponentLink2URL: https://jlcpcb.com/partdetail/C2847437; ComponentLink3Description: LCSC Part URL; ComponentLink3URL: https://lcsc.com/product-detail/Multilayer-Ceramic-Capacitors-MLCC---SMD-SMT_PSAProsperity-Dielectrics-PSAProsperity-Dielectrics-FN21N271J500PAG_C2847437.html
footprint CAP-0805 (0805 (2012M) Capacitor)
pins: 1, 2

## FN21N272J500ECG
designator C?  Capacitance: 2.7nF  (hidden comment: *)
Capacitor, Ceramic (MLCC), 2.7nF, 50V, C0G, SMD 0805; Manufacturer: PSA(Prosperity Dielectrics); Manufacturer Part Number: FN21N272J500ECG; Package Size: 0805; JLCPCB Basic Part: No; JLCPCB Part Number: C2915673; Supplier 1: LCSC; Category: Capacitors - MLCC; Supplier Part Number 1: C2915673; Voltage Rating: 50V; Temperature Coefficient: C0G; RoHS: Yes; ComponentLink1Description: Datasheet; ComponentLink1URL: https://wmsc.lcsc.com/wmsc/upload/file/pdf/v2/lcsc/2111172030_PSA-Prosperity-Dielectrics-FN21N272J500ECG_C2915673.pdf; ComponentLink2Description: JLCPCB Part URL; ComponentLink2URL: https://jlcpcb.com/partdetail/C2915673; ComponentLink3Description: LCSC Part URL; ComponentLink3URL: https://lcsc.com/product-detail/Multilayer-Ceramic-Capacitors-MLCC---SMD-SMT_PSAProsperity-Dielectrics-PSAProsperity-Dielectrics-FN21N272J500ECG_C2915673.html
footprint CAP-0805 (0805 (2012M) Capacitor)
pins: 1, 2

## FN21N330J500PAG
designator C?  Capacitance: 33pF  (hidden comment: *)
Capacitor, Ceramic (MLCC), 33pF, ±5%, 50V, C0G, ±5%, SMD 0805; Manufacturer: PSA(Prosperity Dielectrics); Manufacturer Part Number: FN21N330J500PAG; Package Size: 0805; JLCPCB Basic Part: No; JLCPCB Part Number: C363562; Supplier 1: LCSC; Category: Capacitors - MLCC; Supplier Part Number 1: C363562; Tolerance: ±5%; Voltage Rating: 50V; Temperature Coefficient: C0G; RoHS: Yes; ComponentLink1Description: Datasheet; ComponentLink1URL: https://wmsc.lcsc.com/wmsc/upload/file/pdf/v2/lcsc/2304140030_PSA-Prosperity-Dielectrics-FN21N330J500PAG_C363562.pdf; ComponentLink2Description: JLCPCB Part URL; ComponentLink2URL: https://jlcpcb.com/partdetail/C363562; ComponentLink3Description: LCSC Part URL; ComponentLink3URL: https://lcsc.com/product-detail/Multilayer-Ceramic-Capacitors-MLCC---SMD-SMT_PSAProsperity-Dielectrics-PSAProsperity-Dielectrics-FN21N330J500PAG_C363562.html
footprint CAP-0805 (0805 (2012M) Capacitor)
pins: 1, 2

## FN21N332J500ECG
designator C?  Capacitance: 3.3nF  (hidden comment: *)
Capacitor, Ceramic (MLCC), 3.3nF, 50V, C0G, SMD 0805; Manufacturer: PSA(Prosperity Dielectrics); Manufacturer Part Number: FN21N332J500ECG; Package Size: 0805; JLCPCB Basic Part: No; JLCPCB Part Number: C2915674; Supplier 1: LCSC; Category: Capacitors - MLCC; Supplier Part Number 1: C2915674; Voltage Rating: 50V; Temperature Coefficient: C0G; RoHS: Yes; ComponentLink1Description: Datasheet; ComponentLink1URL: https://wmsc.lcsc.com/wmsc/upload/file/pdf/v2/lcsc/2111172030_PSA-Prosperity-Dielectrics-FN21N332J500ECG_C2915674.pdf; ComponentLink2Description: JLCPCB Part URL; ComponentLink2URL: https://jlcpcb.com/partdetail/C2915674; ComponentLink3Description: LCSC Part URL; ComponentLink3URL: https://lcsc.com/product-detail/Multilayer-Ceramic-Capacitors-MLCC---SMD-SMT_PSAProsperity-Dielectrics-PSAProsperity-Dielectrics-FN21N332J500ECG_C2915674.html
footprint CAP-0805 (0805 (2012M) Capacitor)
pins: 1, 2

## FN21N390J500PAG
designator C?  Capacitance: 39pF  (hidden comment: *)
Capacitor, Ceramic (MLCC), 39pF, ±5%, 50V, C0G, ±5%, SMD 0805; Manufacturer: PSA(Prosperity Dielectrics); Manufacturer Part Number: FN21N390J500PAG; Package Size: 0805; JLCPCB Basic Part: No; JLCPCB Part Number: C565576; Supplier 1: LCSC; Category: Capacitors - MLCC; Supplier Part Number 1: C565576; Tolerance: ±5%; Voltage Rating: 50V; Temperature Coefficient: C0G; RoHS: Yes; ComponentLink1Description: Datasheet; ComponentLink1URL: https://wmsc.lcsc.com/wmsc/upload/file/pdf/v2/lcsc/2304140030_PSA-Prosperity-Dielectrics-FN21N390J500PAG_C565576.pdf; ComponentLink2Description: JLCPCB Part URL; ComponentLink2URL: https://jlcpcb.com/partdetail/C565576; ComponentLink3Description: LCSC Part URL; ComponentLink3URL: https://lcsc.com/product-detail/Multilayer-Ceramic-Capacitors-MLCC---SMD-SMT_PSAProsperity-Dielectrics-PSAProsperity-Dielectrics-FN21N390J500PAG_C565576.html
footprint CAP-0805 (0805 (2012M) Capacitor)
pins: 1, 2

## FN21N391F500PXG
designator C?  Capacitance: 390pF  (hidden comment: *)
Capacitor, Ceramic (MLCC), 390pF, ±1%, 50V, C0G, ±1%, SMD 0805; Manufacturer: PSA(Prosperity Dielectrics); Manufacturer Part Number: FN21N391F500PXG; Package Size: 0805; JLCPCB Basic Part: No; JLCPCB Part Number: C2875134; Supplier 1: LCSC; Category: Capacitors - MLCC; Supplier Part Number 1: C2875134; Tolerance: ±1%; Voltage Rating: 50V; Temperature Coefficient: C0G; RoHS: Yes; ComponentLink1Description: Datasheet; ComponentLink1URL: https://wmsc.lcsc.com/wmsc/upload/file/pdf/v2/lcsc/2109171130_PSA-Prosperity-Dielectrics-FN21N391F500PXG_C2875134.pdf; ComponentLink2Description: JLCPCB Part URL; ComponentLink2URL: https://jlcpcb.com/partdetail/C2875134; ComponentLink3Description: LCSC Part URL; ComponentLink3URL: https://lcsc.com/product-detail/Multilayer-Ceramic-Capacitors-MLCC---SMD-SMT_PSAProsperity-Dielectrics-PSAProsperity-Dielectrics-FN21N391F500PXG_C2875134.html
footprint CAP-0805 (0805 (2012M) Capacitor)
pins: 1, 2
